# Altium footprint library ST Microelectronics STM32 G4.PcbLib: 21 footprints (part 2 of 3) (continued)
## UFQFPN-32 [mm]
pads (32):
  rect 0.6x0.3 smd paste-0.15 mask+0: 1(-2.35,1.75) 2(-2.35,1.25) 3(-2.35,0.75) 4(-2.35,0.25) 5(-2.35,-0.25) 6(-2.35,-0.75) 7(-2.35,-1.25) 8(-2.35,-1.75) 17(2.35,-1.75) 18(2.35,-1.25) 19(2.35,-0.75) 20(2.35,-0.25) 21(2.35,0.25) 22(2.35,0.75) 23(2.35,1.25) 24(2.35,1.75)
  rect 0.3x0.6 smd paste-0.15 mask+0: 9(-1.75,-2.35) 10(-1.25,-2.35) 11(-0.75,-2.35) 12(-0.25,-2.35) 13(0.25,-2.35) 14(0.75,-2.35) 15(1.25,-2.35) 16(1.75,-2.35) 25(1.75,2.35) 26(1.25,2.35) 27(0.75,2.35) 28(0.25,2.35) 29(-0.25,2.35) 30(-0.75,2.35) 31(-1.25,2.35) 32(-1.75,2.35)
Top Overlay:
  region: -0.56,2.904 -0.941,2.904 -0.941,3.158 -0.56,3.158
  region: 2.904,-0.059 3.158,-0.059 3.158,-0.44 2.904,-0.44
  region: -1.06,-2.904 -1.441,-2.904 -1.441,-3.158 -1.06,-3.158
  lines w0.152: -2.931,-2.078 -2.931,-2.931 -2.078,-2.931 ; -2.931,2.078 -2.931,2.931 -2.078,2.931 ; 2.078,-2.931 2.931,-2.931 2.931,-2.078 ; 2.078,2.931 2.931,2.931 2.931,2.078
  text "*" at -3.602,1.746 h1.27
Top Paste:
  region: -1.6,2.65 -1.9,2.65 -1.9,2.05 -1.6,2.05
  region: -1.1,2.65 -1.4,2.65 -1.4,2.05 -1.1,2.05
  region: -0.6,2.65 -0.9,2.65 -0.9,2.05 -0.6,2.05
  region: -0.1,2.65 -0.4,2.65 -0.4,2.05 -0.1,2.05
  region: 0.4,2.65 0.1,2.65 0.1,2.05 0.4,2.05
  region: 0.9,2.65 0.6,2.65 0.6,2.05 0.9,2.05
  region: 1.4,2.65 1.1,2.65 1.1,2.05 1.4,2.05
  region: 1.9,2.65 1.6,2.65 1.6,2.05 1.9,2.05
  region: 2.65,1.9 2.05,1.9 2.05,1.6 2.65,1.6
  region: 2.65,1.4 2.05,1.4 2.05,1.1 2.65,1.1
  region: 2.65,0.9 2.05,0.9 2.05,0.6 2.65,0.6
  region: 2.65,0.4 2.05,0.4 2.05,0.1 2.65,0.1
  region: 2.65,-0.1 2.05,-0.1 2.05,-0.4 2.65,-0.4
  region: 2.65,-0.6 2.05,-0.6 2.05,-0.9 2.65,-0.9
  region: 2.65,-1.1 2.05,-1.1 2.05,-1.4 2.65,-1.4
  region: 2.65,-1.6 2.05,-1.6 2.05,-1.9 2.65,-1.9
  region: 1.9,-2.05 1.6,-2.05 1.6,-2.65 1.9,-2.65
  region: 1.4,-2.05 1.1,-2.05 1.1,-2.65 1.4,-2.65
  region: 0.9,-2.05 0.6,-2.05 0.6,-2.65 0.9,-2.65
  region: 0.4,-2.05 0.1,-2.05 0.1,-2.65 0.4,-2.65
  region: -0.1,-2.05 -0.4,-2.05 -0.4,-2.65 -0.1,-2.65
  region: -0.6,-2.05 -0.9,-2.05 -0.9,-2.65 -0.6,-2.65
  region: -1.1,-2.05 -1.4,-2.05 -1.4,-2.65 -1.1,-2.65
  region: -1.6,-2.05 -1.9,-2.05 -1.9,-2.65 -1.6,-2.65
  region: -2.05,-1.6 -2.65,-1.6 -2.65,-1.9 -2.05,-1.9
  region: -2.05,-1.1 -2.65,-1.1 -2.65,-1.4 -2.05,-1.4
  region: -2.05,-0.6 -2.65,-0.6 -2.65,-0.9 -2.05,-0.9
  region: -2.05,-0.1 -2.65,-0.1 -2.65,-0.4 -2.05,-0.4
  region: -2.05,0.4 -2.65,0.4 -2.65,0.1 -2.05,0.1
  region: -2.05,0.9 -2.65,0.9 -2.65,0.6 -2.05,0.6
  region: -2.05,1.4 -2.65,1.4 -2.65,1.1 -2.05,1.1
  region: -2.05,1.9 -2.65,1.9 -2.65,1.6 -2.05,1.6
Top Solder:
  region: -1.6,2.65 -1.9,2.65 -1.9,2.05 -1.6,2.05
  region: -1.1,2.65 -1.4,2.65 -1.4,2.05 -1.1,2.05
  region: -0.6,2.65 -0.9,2.65 -0.9,2.05 -0.6,2.05
  region: -0.1,2.65 -0.4,2.65 -0.4,2.05 -0.1,2.05
  region: 0.4,2.65 0.1,2.65 0.1,2.05 0.4,2.05
  region: 0.9,2.65 0.6,2.65 0.6,2.05 0.9,2.05
  region: 1.4,2.65 1.1,2.65 1.1,2.05 1.4,2.05
  region: 1.9,2.65 1.6,2.65 1.6,2.05 1.9,2.05
  region: 2.65,1.9 2.05,1.9 2.05,1.6 2.65,1.6
  region: 2.65,1.4 2.05,1.4 2.05,1.1 2.65,1.1
  region: 2.65,0.9 2.05,0.9 2.05,0.6 2.65,0.6
  region: 2.65,0.4 2.05,0.4 2.05,0.1 2.65,0.1
  region: 2.65,-0.1 2.05,-0.1 2.05,-0.4 2.65,-0.4
  region: 2.65,-0.6 2.05,-0.6 2.05,-0.9 2.65,-0.9
  region: 2.65,-1.1 2.05,-1.1 2.05,-1.4 2.65,-1.4
  region: 2.65,-1.6 2.05,-1.6 2.05,-1.9 2.65,-1.9
  region: 1.9,-2.05 1.6,-2.05 1.6,-2.65 1.9,-2.65
  region: 1.4,-2.05 1.1,-2.05 1.1,-2.65 1.4,-2.65
  region: 0.9,-2.05 0.6,-2.05 0.6,-2.65 0.9,-2.65
  region: 0.4,-2.05 0.1,-2.05 0.1,-2.65 0.4,-2.65
  region: -0.1,-2.05 -0.4,-2.05 -0.4,-2.65 -0.1,-2.65
  region: -0.6,-2.05 -0.9,-2.05 -0.9,-2.65 -0.6,-2.65
  region: -1.1,-2.05 -1.4,-2.05 -1.4,-2.65 -1.1,-2.65
  region: -1.6,-2.05 -1.9,-2.05 -1.9,-2.65 -1.6,-2.65
  region: -2.05,-1.6 -2.65,-1.6 -2.65,-1.9 -2.05,-1.9
  region: -2.05,-1.1 -2.65,-1.1 -2.65,-1.4 -2.05,-1.4
  region: -2.05,-0.6 -2.65,-0.6 -2.65,-0.9 -2.05,-0.9
  region: -2.05,-0.1 -2.65,-0.1 -2.65,-0.4 -2.05,-0.4
  region: -2.05,0.4 -2.65,0.4 -2.65,0.1 -2.05,0.1
  region: -2.05,0.9 -2.65,0.9 -2.65,0.6 -2.05,0.6
  region: -2.05,1.4 -2.65,1.4 -2.65,1.1 -2.05,1.1
  region: -2.05,1.9 -2.65,1.9 -2.65,1.6 -2.05,1.6
Mechanical 5:
  region: 3.285,-3.285 -3.285,-3.285 -3.285,3.285 3.285,3.285
Mechanical 7:
  lines w0.025: -6.206,-2.55 2.55,-2.55 ; -6.206,2.55 2.55,2.55 2.55,-6.056 ; -2.55,-6.056 -2.55,2.55 ; -2.35,1.75 -2.35,7.326 ; 1.75,-2.35 7.476,-2.35 ; 1.75,2.35 7.476,2.35 ; 2.35,1.25 5.571,1.25 ; 2.35,7.326 2.35,1.75 5.571,1.75 ; 5.19,-0.02 5.19,1.25 ; 5.19,3.02 5.19,1.75 ; -5.825,-2.55 -5.698,-2.296 -5.952,-2.296 -5.825,-2.55 ; -5.825,-2.55 -5.825,2.55 ; -5.825,2.55 -5.698,2.296 -5.952,2.296 -5.825,2.55 ; -2.55,-5.675 -2.296,-5.802 -2.296,-5.548 -2.55,-5.675 ; -2.55,-5.675 2.55,-5.675 ; -2.35,6.945 -2.096,6.818 -2.096,7.072 -2.35,6.945 ; -2.35,6.945 2.35,6.945 ; 2.35,6.945 2.096,6.818 2.096,7.072 2.35,6.945 ; 2.55,-5.675 2.296,-5.802 2.296,-5.548 2.55,-5.675 ; 5.19,1.25 5.317,0.996 5.063,0.996 5.19,1.25 ; 5.19,1.75 5.317,2.004 5.063,2.004 5.19,1.75 ; 7.095,-2.35 7.222,-2.096 6.968,-2.096 7.095,-2.35 ; 7.095,-2.35 7.095,2.35 ; 7.095,2.35 7.222,2.096 6.968,2.096 7.095,2.35
  text "0.201in/5.1mm" at -2.064,-6.818 h0.64
  text "0.201in/5.1mm" at -10.46,-0.318 h0.64
  text "0.185in/4.7mm" at 7.603,-0.318 h0.64
  text "0.185in/4.7mm" at -2.064,7.453 h0.64
  text "0.02in/0.5mm" at 5.698,1.182 h0.64
  text "Alt 2 Padstyle: OX60Y90D30P" at -8.572,-14.946 h1.27
  text "Alt 1 Padstyle: OX90Y60D30P" at -8.572,-13.422 h1.27
  text "Default Padstyle: RX23p62Y11p81D0T" at -10.795,-8.85 h1.27
Mechanical 13:
  lines w0.025: -2.55,1.28 -1.28,2.55 ; -2.55,-2.55 -2.55,2.55 2.55,2.55 2.55,-2.55 -2.55,-2.55
  text "*" at -2.114,1.365 h1.27
Mechanical 15:
  region: -2.154,-2.804 -2.804,-2.804 -2.804,-2.154 -2.904,-2.154 -2.904,2.154 -2.804,2.154 -2.804,2.804 -2.154,2.804 -2.154,2.904 2.154,2.904 2.154,2.804 2.804,2.804 2.804,2.154 2.904,2.154 2.904,-2.154 2.804,-2.154 2.804,-2.804 2.154,-2.804 2.154,-2.904 -2.154,-2.904
  lines w0.152: -2.904,-2.154 -2.904,2.154 -2.804,2.154 -2.804,2.804 -2.154,2.804 -2.154,2.904 2.154,2.904 2.154,2.804 2.804,2.804 2.804,2.154 2.904,2.154 2.904,-2.154 2.804,-2.154 2.804,-2.804 2.154,-2.804 2.154,-2.904 -2.154,-2.904 -2.154,-2.804 -2.804,-2.804 -2.804,-2.154 -2.904,-2.154
3D body "UFQFPN-32.step": height 1.4, standoff 0, extent -2.601,-2.601 2.601,2.601

## UFQFPN-48_7X7X00 [mil]
pads (49):
  rect 36x12 smd paste+0 mask+0: 1(-138,108.27) 2(-138,88.58) 3(-138,68.9) 4(-138,49.21) 5(-138,29.53) 6(-138,9.84) 7(-138,-9.84) 8(-138,-29.53) 9(-138,-49.21) 10(-138,-68.9) 11(-138,-88.58) 12(-138,-108.27) 25(138,-108.27) 26(138,-88.58) 27(138,-68.9) 28(138,-49.21) 29(138,-29.53) 30(138,-9.84) 31(138,9.84) 32(138,29.53) 33(138,49.21) 34(138,68.9) 35(138,88.58) 36(138,108.27)
  rect 12x36 smd paste+0 mask+0: 13(-108.27,-138) 14(-88.58,-138) 15(-68.9,-138) 16(-49.21,-138) 17(-29.53,-138) 18(-9.84,-138) 19(9.84,-138) 20(29.53,-138) 21(49.21,-138) 22(68.9,-138) 23(88.58,-138) 24(108.27,-138) 37(108.27,138) 38(88.58,138) 39(68.9,138) 40(49.21,138) 41(29.53,138) 42(9.84,138) 43(-9.84,138) 44(-29.53,138) 45(-49.21,138) 46(-68.9,138) 47(-88.58,138) 48(-108.27,138)
  rect 224x224 smd paste-111.5 mask+0: 49(0,0)
Top Overlay:
  region: -166,-61.4 -176,-61.4 -176,-76.4 -166,-76.4
  region: 37.03,-166 22.03,-166 22.03,-176 37.03,-176
  region: 166,-2.34 176,-2.34 176,-17.34 166,-17.34
  region: 56.71,166 41.71,166 41.71,176 56.71,176
  lines w6: -145,-127.37 -145,-145 -127.37,-145 ; -145,127.37 -145,145 -127.37,145 ; 127.37,-145 145,-145 145,-127.37 ; 127.37,145 145,145 145,127.37
  text "*" at -193.5,93.11 h50
Top Paste:
  region: -59.94,108.06 -108.06,108.06 -108.06,59.94 -59.94,59.94
  region: -59.94,52.06 -108.06,52.06 -108.06,3.94 -59.94,3.94
  region: -59.94,-3.94 -108.06,-3.94 -108.06,-52.06 -59.94,-52.06
  region: -59.94,-59.94 -108.06,-59.94 -108.06,-108.06 -59.94,-108.06
  region: -3.94,108.06 -52.06,108.06 -52.06,59.94 -3.94,59.94
  region: -3.94,52.06 -52.06,52.06 -52.06,3.94 -3.94,3.94
  region: -3.94,-3.94 -52.06,-3.94 -52.06,-52.06 -3.94,-52.06
  region: -3.94,-59.94 -52.06,-59.94 -52.06,-108.06 -3.94,-108.06
  region: 52.06,108.06 3.94,108.06 3.94,59.94 52.06,59.94
  region: 52.06,52.06 3.94,52.06 3.94,3.94 52.06,3.94
  region: 52.06,-3.94 3.94,-3.94 3.94,-52.06 52.06,-52.06
  region: 52.06,-59.94 3.94,-59.94 3.94,-108.06 52.06,-108.06
  region: 108.06,108.06 59.94,108.06 59.94,59.94 108.06,59.94
  region: 108.06,52.06 59.94,52.06 59.94,3.94 108.06,3.94
  region: 108.06,-3.94 59.94,-3.94 59.94,-52.06 108.06,-52.06
  region: 108.06,-59.94 59.94,-59.94 59.94,-108.06 108.06,-108.06
Mechanical 5:
  region: 191,-191 -191,-191 -191,191 191,191
Mechanical 7:
  lines w1: -288,-140 140,-140 ; -288,140 140,140 140,-288 ; -140,-288 -140,140 ; -140,108.27 -140,338 ; 70,248 120,248 ; 108.27,-140 338,-140 ; 108.27,140 338,140 ; 120,108.27 120,263 ; 138,88.58 263,88.58 ; 138,108.27 263,108.27 ; 140,263 140,108.27 140,338 ; 190,248 140,248 ; 248,38.58 248,88.58 ; 248,158.27 248,108.27 ; -273,-140 -273,140 ; -273,-140 -278,-130 -268,-130 -273,-140 ; -273,140 -278,130 -268,130 -273,140 ; -140,-273 140,-273 ; -140,-273 -130,-268 -130,-278 -140,-273 ; -140,323 140,323 ; -140,323 -130,328 -130,318 -140,323 ; 120,248 110,253 110,243 120,248 ; 140,-273 130,-268 130,-278 140,-273 ; 140,248 150,253 150,243 140,248 ; 140,323 130,328 130,318 140,323 ; 248,88.58 243,78.58 253,78.58 248,88.58 ; 248,108.27 243,118.27 253,118.27 248,108.27 ; 323,-140 323,140 ; 323,-140 318,-130 328,-130 323,-140 ; 323,140 318,130 328,130 323,140
  text "Default Padstyle: RX36Y12D0T" at -350,-466 h50
  text "Heat Tab Padstyle: RX224Y224D0T" at -387.5,-526 h50
  text "Alt 1 Padstyle: OX90Y60D30P" at -337.5,-646 h50
  text "Alt 2 Padstyle: OX60Y90D30P" at -337.5,-706 h50
  text "0.02in/0.5mm" at 268,85.93 h25
  text "0.02in/0.508mm" at 42.5,268 h25
  text "0.28in/7.112mm" at -87.5,343 h25
  text "0.28in/7.112mm" at 343,-12.5 h25
  text "0.28in/7.112mm" at -468,-12.5 h25
  text "0.28in/7.112mm" at -87.5,-318 h25
Mechanical 13:
  lines w1: -140,90 -90,140 ; -140,-140 140,-140 140,140 -140,140 -140,-140 ; -140,-114.27 -140,-102.27 -140,-114.27 ; -140,-94.58 -140,-82.58 -140,-94.58 ; -140,-74.9 -140,-62.9 -140,-74.9 ; -140,-55.21 -140,-43.21 -140,-55.21 ; -140,-35.53 -140,-23.53 -140,-35.53 ; -140,-15.84 -140,-3.84 -140,-15.84 ; -140,3.84 -140,15.84 -140,3.84 ; -140,23.53 -140,35.53 -140,23.53 ; -140,43.21 -140,55.21 -140,43.21 ; -140,62.9 -140,74.9 -140,62.9 ; -140,82.58 -140,94.58 -140,82.58 ; -140,102.27 -140,114.27 -140,102.27 ; -114.27,-140 -102.27,-140 -114.27,-140 ; -114.27,140 -102.27,140 -114.27,140 ; -94.58,-140 -82.58,-140 -94.58,-140 ; -94.58,140 -82.58,140 -94.58,140 ; -74.9,-140 -62.9,-140 -74.9,-140 ; -74.9,140 -62.9,140 -74.9,140 ; -55.21,-140 -43.21,-140 -55.21,-140 ; -55.21,140 -43.21,140 -55.21,140 ; -35.53,-140 -23.53,-140 -35.53,-140 ; -35.53,140 -23.53,140 -35.53,140 ; -15.84,-140 -3.84,-140 -15.84,-140 ; -15.84,140 -3.84,140 -15.84,140 ; 3.84,-140 15.84,-140 3.84,-140 ; 3.84,140 15.84,140 3.84,140 ; 23.53,-140 35.53,-140 23.53,-140 ; 23.53,140 35.53,140 23.53,140 ; 43.21,-140 55.21,-140 43.21,-140 ; 43.21,140 55.21,140 43.21,140 ; 62.9,-140 74.9,-140 62.9,-140 ; 62.9,140 74.9,140 62.9,140 ; 82.58,-140 94.58,-140 82.58,-140 ; 82.58,140 94.58,140 82.58,140 ; 102.27,-140 114.27,-140 102.27,-140 ; 102.27,140 114.27,140 102.27,140 ; 140,-114.27 140,-102.27 140,-114.27 ; 140,-94.58 140,-82.58 140,-94.58 ; 140,-74.9 140,-62.9 140,-74.9 ; 140,-55.21 140,-43.21 140,-55.21 ; 140,-35.53 140,-23.53 140,-35.53 ; 140,-15.84 140,-3.84 140,-15.84 ; 140,3.84 140,15.84 140,3.84 ; 140,23.53 140,35.53 140,23.53 ; 140,43.21 140,55.21 140,43.21 ; 140,62.9 140,74.9 140,62.9 ; 140,82.58 140,94.58 140,82.58 ; 140,102.27 140,114.27 140,102.27
  text "*" at -132.5,93.11 h50
Mechanical 15:
  region: -118.11,-160 -160,-160 -160,-118.11 -170,-118.11 -170,118.11 -160,118.11 -160,160 -118.11,160 -118.11,170 118.11,170 118.11,160 160,160 160,118.11 170,118.11 170,-118.11 160,-118.11 160,-160 118.11,-160 118.11,-170 -118.11,-170
  lines w6: -170,-118.11 -160,-118.11 -160,-160 -118.11,-160 -118.11,-170 118.11,-170 118.11,-160 160,-160 160,-118.11 170,-118.11 170,118.11 160,118.11 160,160 118.11,160 118.11,170 -118.11,170 -118.11,160 -160,160 -160,118.11 -170,118.11 -170,-118.11
3D body "UFQFPN-48_7X7X00.step": height 24.09, standoff 0, extent -139.99,-139.99 140.01,140.01

## UFQFPN-48_7X7X0P [mil]
pads (49):
  rect 32x12 smd paste+0 mask+0: 1(-136,108.27) 2(-136,88.58) 3(-136,68.9) 4(-136,49.21) 5(-136,29.53) 6(-136,9.84) 7(-136,-9.84) 8(-136,-29.53) 9(-136,-49.21) 10(-136,-68.9) 11(-136,-88.58) 12(-136,-108.27) 25(136,-108.27) 26(136,-88.58) 27(136,-68.9) 28(136,-49.21) 29(136,-29.53) 30(136,-9.84) 31(136,9.84) 32(136,29.53) 33(136,49.21) 34(136,68.9) 35(136,88.58) 36(136,108.27)
  rect 12x32 smd paste+0 mask+0: 13(-108.27,-136) 14(-88.58,-136) 15(-68.9,-136) 16(-49.21,-136) 17(-29.53,-136) 18(-9.84,-136) 19(9.84,-136) 20(29.53,-136) 21(49.21,-136) 22(68.9,-136) 23(88.58,-136) 24(108.27,-136) 37(108.27,136) 38(88.58,136) 39(68.9,136) 40(49.21,136) 41(29.53,136) 42(9.84,136) 43(-9.84,136) 44(-29.53,136) 45(-49.21,136) 46(-68.9,136) 47(-88.58,136) 48(-108.27,136)
  rect 224x224 smd paste-111.5 mask+0: 49(0,0)
Top Overlay:
  region: -162,-61.4 -172,-61.4 -172,-76.4 -162,-76.4
  region: 37.03,-162 22.03,-162 22.03,-172 37.03,-172
  region: 162,-2.34 172,-2.34 172,-17.34 162,-17.34
  region: 56.71,162 41.71,162 41.71,172 56.71,172
  lines w6: -145,-127.37 -145,-145 -127.37,-145 ; -145,127.37 -145,145 -127.37,145 ; 127.37,-145 145,-145 145,-127.37 ; 127.37,145 145,145 145,127.37
  text "*" at -189.5,93.11 h50
Top Paste:
  region: -59.94,108.06 -108.06,108.06 -108.06,59.94 -59.94,59.94
  region: -59.94,52.06 -108.06,52.06 -108.06,3.94 -59.94,3.94
  region: -59.94,-3.94 -108.06,-3.94 -108.06,-52.06 -59.94,-52.06
  region: -59.94,-59.94 -108.06,-59.94 -108.06,-108.06 -59.94,-108.06
  region: -3.94,108.06 -52.06,108.06 -52.06,59.94 -3.94,59.94
  region: -3.94,52.06 -52.06,52.06 -52.06,3.94 -3.94,3.94
  region: -3.94,-3.94 -52.06,-3.94 -52.06,-52.06 -3.94,-52.06
  region: -3.94,-59.94 -52.06,-59.94 -52.06,-108.06 -3.94,-108.06
  region: 52.06,108.06 3.94,108.06 3.94,59.94 52.06,59.94
  region: 52.06,52.06 3.94,52.06 3.94,3.94 52.06,3.94
  region: 52.06,-3.94 3.94,-3.94 3.94,-52.06 52.06,-52.06
  region: 52.06,-59.94 3.94,-59.94 3.94,-108.06 52.06,-108.06
  region: 108.06,108.06 59.94,108.06 59.94,59.94 108.06,59.94
  region: 108.06,52.06 59.94,52.06 59.94,3.94 108.06,3.94
  region: 108.06,-3.94 59.94,-3.94 59.94,-52.06 108.06,-52.06
  region: 108.06,-59.94 59.94,-59.94 59.94,-108.06 108.06,-108.06
Mechanical 5:
  region: 177,-177 -177,-177 -177,177 177,177
Mechanical 7:
  lines w1: -286,-140 140,-140 ; -286,140 140,140 140,-286 ; -140,-286 -140,140 ; -140,108.27 -140,336 ; 70,246 120,246 ; 108.27,-140 336,-140 ; 108.27,140 336,140 ; 120,108.27 120,261 ; 136,88.58 261,88.58 ; 136,108.27 261,108.27 ; 140,261 140,108.27 140,336 ; 190,246 140,246 ; 246,38.58 246,88.58 ; 246,158.27 246,108.27 ; -271,-140 -271,140 ; -271,-140 -276,-130 -266,-130 -271,-140 ; -271,140 -276,130 -266,130 -271,140 ; -140,-271 140,-271 ; -140,-271 -130,-266 -130,-276 -140,-271 ; -140,321 140,321 ; -140,321 -130,326 -130,316 -140,321 ; 120,246 110,251 110,241 120,246 ; 140,-271 130,-266 130,-276 140,-271 ; 140,246 150,251 150,241 140,246 ; 140,321 130,326 130,316 140,321 ; 246,88.58 241,78.58 251,78.58 246,88.58 ; 246,108.27 241,118.27 251,118.27 246,108.27 ; 321,-140 321,140 ; 321,-140 316,-130 326,-130 321,-140 ; 321,140 316,130 326,130 321,140
  text "Default Padstyle: RX32Y12D0T" at -350,-462 h50
  text "Heat Tab Padstyle: RX224Y224D0T" at -387.5,-522 h50
  text "Alt 1 Padstyle: OX90Y60D30P" at -337.5,-642 h50
  text "Alt 2 Padstyle: OX60Y90D30P" at -337.5,-702 h50
  text "0.02in/0.5mm" at 266,85.93 h25
  text "0.02in/0.508mm" at 42.5,266 h25
  text "0.28in/7.112mm" at -87.5,341 h25
  text "0.28in/7.112mm" at 341,-12.5 h25
  text "0.28in/7.112mm" at -466,-12.5 h25
  text "0.28in/7.112mm" at -87.5,-316 h25
Mechanical 13:
  lines w1: -140,90 -90,140 ; -140,-140 140,-140 140,140 -140,140 -140,-140 ; -140,-114.27 -140,-102.27 -140,-114.27 ; -140,-94.58 -140,-82.58 -140,-94.58 ; -140,-74.9 -140,-62.9 -140,-74.9 ; -140,-55.21 -140,-43.21 -140,-55.21 ; -140,-35.53 -140,-23.53 -140,-35.53 ; -140,-15.84 -140,-3.84 -140,-15.84 ; -140,3.84 -140,15.84 -140,3.84 ; -140,23.53 -140,35.53 -140,23.53 ; -140,43.21 -140,55.21 -140,43.21 ; -140,62.9 -140,74.9 -140,62.9 ; -140,82.58 -140,94.58 -140,82.58 ; -140,102.27 -140,114.27 -140,102.27 ; -114.27,-140 -102.27,-140 -114.27,-140 ; -114.27,140 -102.27,140 -114.27,140 ; -94.58,-140 -82.58,-140 -94.58,-140 ; -94.58,140 -82.58,140 -94.58,140 ; -74.9,-140 -62.9,-140 -74.9,-140 ; -74.9,140 -62.9,140 -74.9,140 ; -55.21,-140 -43.21,-140 -55.21,-140 ; -55.21,140 -43.21,140 -55.21,140 ; -35.53,-140 -23.53,-140 -35.53,-140 ; -35.53,140 -23.53,140 -35.53,140 ; -15.84,-140 -3.84,-140 -15.84,-140 ; -15.84,140 -3.84,140 -15.84,140 ; 3.84,-140 15.84,-140 3.84,-140 ; 3.84,140 15.84,140 3.84,140 ; 23.53,-140 35.53,-140 23.53,-140 ; 23.53,140 35.53,140 23.53,140 ; 43.21,-140 55.21,-140 43.21,-140 ; 43.21,140 55.21,140 43.21,140 ; 62.9,-140 74.9,-140 62.9,-140 ; 62.9,140 74.9,140 62.9,140 ; 82.58,-140 94.58,-140 82.58,-140 ; 82.58,140 94.58,140 82.58,140 ; 102.27,-140 114.27,-140 102.27,-140 ; 102.27,140 114.27,140 102.27,140 ; 140,-114.27 140,-102.27 140,-114.27 ; 140,-94.58 140,-82.58 140,-94.58 ; 140,-74.9 140,-62.9 140,-74.9 ; 140,-55.21 140,-43.21 140,-55.21 ; 140,-35.53 140,-23.53 140,-35.53 ; 140,-15.84 140,-3.84 140,-15.84 ; 140,3.84 140,15.84 140,3.84 ; 140,23.53 140,35.53 140,23.53 ; 140,43.21 140,55.21 140,43.21 ; 140,62.9 140,74.9 140,62.9 ; 140,82.58 140,94.58 140,82.58 ; 140,102.27 140,114.27 140,102.27
  text "*" at -132.5,93.11 h50
Mechanical 15:
  region: -118.11,-150 -150,-150 -150,-118.11 -160,-118.11 -160,118.11 -150,118.11 -150,150 -118.11,150 -118.11,160 118.11,160 118.11,150 150,150 150,118.11 160,118.11 160,-118.11 150,-118.11 150,-150 118.11,-150 118.11,-160 -118.11,-160
  lines w6: -160,-118.11 -150,-118.11 -150,-150 -118.11,-150 -118.11,-160 118.11,-160 118.11,-150 150,-150 150,-118.11 160,-118.11 160,118.11 150,118.11 150,150 118.11,150 118.11,160 -118.11,160 -118.11,150 -150,150 -150,118.11 -160,118.11 -160,-118.11
3D body "UFQFPN-48_7X7X0P.step": height 24.09, standoff 0, extent -139.99,-139.99 140.01,140.01

## UFQFPN-48_7X7X01 [mil]
pads (49):
  rect 28x12 smd paste+0 mask+0: 1(-134,108.27) 2(-134,88.58) 3(-134,68.9) 4(-134,49.21) 5(-134,29.53) 6(-134,9.84) 7(-134,-9.84) 8(-134,-29.53) 9(-134,-49.21) 10(-134,-68.9) 11(-134,-88.58) 12(-134,-108.27) 25(134,-108.27) 26(134,-88.58) 27(134,-68.9) 28(134,-49.21) 29(134,-29.53) 30(134,-9.84) 31(134,9.84) 32(134,29.53) 33(134,49.21) 34(134,68.9) 35(134,88.58) 36(134,108.27)
  rect 12x28 smd paste+0 mask+0: 13(-108.27,-134) 14(-88.58,-134) 15(-68.9,-134) 16(-49.21,-134) 17(-29.53,-134) 18(-9.84,-134) 19(9.84,-134) 20(29.53,-134) 21(49.21,-134) 22(68.9,-134) 23(88.58,-134) 24(108.27,-134) 37(108.27,134) 38(88.58,134) 39(68.9,134) 40(49.21,134) 41(29.53,134) 42(9.84,134) 43(-9.84,134) 44(-29.53,134) 45(-49.21,134) 46(-68.9,134) 47(-88.58,134) 48(-108.27,134)
  rect 224x224 smd paste-111.5 mask+0: 49(0,0)
Top Overlay:
  region: 56.71,158 41.71,158 41.71,168 56.71,168
  region: 158,-2.34 168,-2.34 168,-17.34 158,-17.34
  region: 37.03,-158 22.03,-158 22.03,-168 37.03,-168
  region: -158,-61.4 -168,-61.4 -168,-76.4 -158,-76.4
  lines w6: -145,-127.37 -145,-145 -127.37,-145 ; -145,127.37 -145,145 -127.37,145 ; 127.37,-145 145,-145 145,-127.37 ; 127.37,145 145,145 145,127.37
  text "*" at -185.5,93.11 h50
Top Paste:
  region: 108.06,-59.94 59.94,-59.94 59.94,-108.06 108.06,-108.06
  region: 108.06,-3.94 59.94,-3.94 59.94,-52.06 108.06,-52.06
  region: 108.06,52.06 59.94,52.06 59.94,3.94 108.06,3.94
  region: 108.06,108.06 59.94,108.06 59.94,59.94 108.06,59.94
  region: 52.06,-59.94 3.94,-59.94 3.94,-108.06 52.06,-108.06
  region: 52.06,-3.94 3.94,-3.94 3.94,-52.06 52.06,-52.06
  region: 52.06,52.06 3.94,52.06 3.94,3.94 52.06,3.94
  region: 52.06,108.06 3.94,108.06 3.94,59.94 52.06,59.94
  region: -3.94,-59.94 -52.06,-59.94 -52.06,-108.06 -3.94,-108.06
  region: -3.94,-3.94 -52.06,-3.94 -52.06,-52.06 -3.94,-52.06
  region: -3.94,52.06 -52.06,52.06 -52.06,3.94 -3.94,3.94
  region: -3.94,108.06 -52.06,108.06 -52.06,59.94 -3.94,59.94
  region: -59.94,-59.94 -108.06,-59.94 -108.06,-108.06 -59.94,-108.06
  region: -59.94,-3.94 -108.06,-3.94 -108.06,-52.06 -59.94,-52.06
  region: -59.94,52.06 -108.06,52.06 -108.06,3.94 -59.94,3.94
  region: -59.94,108.06 -108.06,108.06 -108.06,59.94 -59.94,59.94
Mechanical 5:
  region: 167,-167 -167,-167 -167,167 167,167
Mechanical 7:
  lines w1: -284,-140 140,-140 ; -284,140 140,140 140,-284 ; -140,-284 -140,140 ; -140,108.27 -140,334 ; 70,244 120,244 ; 108.27,-140 334,-140 ; 108.27,140 334,140 ; 120,108.27 120,259 ; 134,88.58 259,88.58 ; 134,108.27 259,108.27 ; 140,259 140,108.27 140,334 ; 190,244 140,244 ; 244,38.58 244,88.58 ; 244,158.27 244,108.27 ; -269,-140 -264,-130 -274,-130 -269,-140 ; -269,-140 -269,140 ; -269,140 -264,130 -274,130 -269,140 ; -140,-269 -130,-274 -130,-264 -140,-269 ; -140,-269 140,-269 ; -140,319 -130,314 -130,324 -140,319 ; -140,319 140,319 ; 120,244 110,239 110,249 120,244 ; 140,-269 130,-274 130,-264 140,-269 ; 140,244 150,239 150,249 140,244 ; 140,319 130,314 130,324 140,319 ; 244,88.58 249,78.58 239,78.58 244,88.58 ; 244,108.27 249,118.27 239,118.27 244,108.27 ; 319,-140 324,-130 314,-130 319,-140 ; 319,-140 319,140 ; 319,140 324,130 314,130 319,140
  text "0.28in/7.112mm" at -87.5,-314 h25
  text "0.28in/7.112mm" at -464,-12.5 h25
  text "0.28in/7.112mm" at 339,-12.5 h25
  text "0.28in/7.112mm" at -87.5,339 h25
  text "0.02in/0.508mm" at 42.5,264 h25
  text "0.02in/0.5mm" at 264,85.93 h25
  text "Alt 2 Padstyle: OX60Y90D30P" at -337.5,-698 h50
  text "Alt 1 Padstyle: OX90Y60D30P" at -337.5,-638 h50
  text "Heat Tab Padstyle: RX224Y224D0T" at -387.5,-518 h50
  text "Default Padstyle: RX28Y12D0T" at -350,-458 h50
Mechanical 13:
  lines w1: -140,90 -90,140 ; -140,-140 -140,140 140,140 140,-140 -140,-140 ; -140,-114.27 -140,-102.27 -140,-114.27 ; -140,-94.58 -140,-82.58 -140,-94.58 ; -140,-74.9 -140,-62.9 -140,-74.9 ; -140,-55.21 -140,-43.21 -140,-55.21 ; -140,-35.53 -140,-23.53 -140,-35.53 ; -140,-15.84 -140,-3.84 -140,-15.84 ; -140,3.84 -140,15.84 -140,3.84 ; -140,23.53 -140,35.53 -140,23.53 ; -140,43.21 -140,55.21 -140,43.21 ; -140,62.9 -140,74.9 -140,62.9 ; -140,82.58 -140,94.58 -140,82.58 ; -140,102.27 -140,114.27 -140,102.27 ; -114.27,-140 -102.27,-140 -114.27,-140 ; -114.27,140 -102.27,140 -114.27,140 ; -94.58,-140 -82.58,-140 -94.58,-140 ; -94.58,140 -82.58,140 -94.58,140 ; -74.9,-140 -62.9,-140 -74.9,-140 ; -74.9,140 -62.9,140 -74.9,140 ; -55.21,-140 -43.21,-140 -55.21,-140 ; -55.21,140 -43.21,140 -55.21,140 ; -35.53,-140 -23.53,-140 -35.53,-140 ; -35.53,140 -23.53,140 -35.53,140 ; -15.84,-140 -3.84,-140 -15.84,-140 ; -15.84,140 -3.84,140 -15.84,140 ; 3.84,-140 15.84,-140 3.84,-140 ; 3.84,140 15.84,140 3.84,140 ; 23.53,-140 35.53,-140 23.53,-140 ; 23.53,140 35.53,140 23.53,140 ; 43.21,-140 55.21,-140 43.21,-140 ; 43.21,140 55.21,140 43.21,140 ; 62.9,-140 74.9,-140 62.9,-140 ; 62.9,140 74.9,140 62.9,140 ; 82.58,-140 94.58,-140 82.58,-140 ; 82.58,140 94.58,140 82.58,140 ; 102.27,-140 114.27,-140 102.27,-140 ; 102.27,140 114.27,140 102.27,140 ; 140,-114.27 140,-102.27 140,-114.27 ; 140,-94.58 140,-82.58 140,-94.58 ; 140,-74.9 140,-62.9 140,-74.9 ; 140,-55.21 140,-43.21 140,-55.21 ; 140,-35.53 140,-23.53 140,-35.53 ; 140,-15.84 140,-3.84 140,-15.84 ; 140,3.84 140,15.84 140,3.84 ; 140,23.53 140,35.53 140,23.53 ; 140,43.21 140,55.21 140,43.21 ; 140,62.9 140,74.9 140,62.9 ; 140,82.58 140,94.58 140,82.58 ; 140,102.27 140,114.27 140,102.27
  text "*" at -132.5,93.11 h50
Mechanical 15:
  region: -118.11,-144 -144,-144 -144,-118.11 -154,-118.11 -154,118.11 -144,118.11 -144,144 -118.11,144 -118.11,154 118.11,154 118.11,144 144,144 144,118.11 154,118.11 154,-118.11 144,-118.11 144,-144 118.11,-144 118.11,-154 -118.11,-154
  lines w6: -154,-118.11 -154,118.11 -144,118.11 -144,144 -118.11,144 -118.11,154 118.11,154 118.11,144 144,144 144,118.11 154,118.11 154,-118.11 144,-118.11 144,-144 118.11,-144 118.11,-154 -118.11,-154 -118.11,-144 -144,-144 -144,-118.11 -154,-118.11
3D body "UFQFPN-48_7X7X01.step": height 24.09, standoff 0, extent -139.99,-139.99 140.01,140.01

## WLCSP49 [mil]
pads (49):
  round 11 hole 10 mask+0: A1(-47.24,47.24) A2(-31.5,47.24) A3(-15.75,47.24) A4(0,47.24) A5(15.75,47.24) A6(31.5,47.24) A7(47.24,47.24) B1(-47.24,31.5) B2(-31.5,31.5) B3(-15.75,31.5) B4(0,31.5) B5(15.75,31.5) B6(31.5,31.5) B7(47.24,31.5) C1(-47.24,15.75) C2(-31.5,15.75) C3(-15.75,15.75) C4(0,15.75) C5(15.75,15.75) C6(31.5,15.75) C7(47.24,15.75) D1(-47.24,0) D2(-31.5,0) D3(-15.75,0) D4(0,0) D5(15.75,0) D6(31.5,0) D7(47.24,0) E1(-47.24,-15.75) E2(-31.5,-15.75) E3(-15.75,-15.75) E4(0,-15.75) E5(15.75,-15.75) E6(31.5,-15.75) E7(47.24,-15.75) F1(-47.24,-31.5) F2(-31.5,-31.5) F3(-15.75,-31.5) F4(0,-31.5) F5(15.75,-31.5) F6(31.5,-31.5) F7(47.24,-31.5) G1(-47.24,-47.24) G2(-31.5,-47.24) G3(-15.75,-47.24) G4(0,-47.24) G5(15.75,-47.24) G6(31.5,-47.24) G7(47.24,-47.24)
Top Overlay:
  lines w6: -67.5,-67 67.5,-67 67.5,67 -67.5,67 -67.5,-67
  text "A" at -112.5,22.24 h50
  text "G" at -112.5,-72.24 h50
  text "1" at -22.24,87 h50
  text "7" at 72.24,87 h50
Bottom Overlay:
  text "A" at -87.5,22.24 h50
  text "G" at -87.5,-72.24 h50
  text "1" at -72.24,87 h50
  text "7" at 22.24,87 h50
Keep-Out Layer:
  region: -72.62,-72.62 -72.62,72.62 72.62,72.62 72.62,-72.62
Mechanical 5:
  region: 77.5,-77 -77.5,-77 -77.5,77 77.5,77
Mechanical 7:
  lines w1: -112.5,137 -62.5,137 ; -62.5,0 -62.5,152 ; 0,-62 227.5,-62 ; 0,62 227.5,62 ; 47.24,31.5 152.5,31.5 ; 47.24,47.24 152.5,47.24 ; 62.5,0 62.5,152 ; 112.5,137 62.5,137 ; 137.5,-18.5 137.5,31.5 ; 137.5,97.24 137.5,47.24 ; 212.5,-112 212.5,-62 ; 212.5,112 212.5,62 ; -62.5,137 -72.5,142 -72.5,132 -62.5,137 ; 62.5,137 72.5,142 72.5,132 62.5,137 ; 137.5,31.5 132.5,21.5 142.5,21.5 137.5,31.5 ; 137.5,47.24 132.5,57.24 142.5,57.24 137.5,47.24 ; 212.5,-62 207.5,-72 217.5,-72 212.5,-62 ; 212.5,62 207.5,72 217.5,72 212.5,62
  text "Default Padstyle: EX11Y11D10PA" at -375,-262 h50
  text "0.016in/0.4mm" at 157.5,26.87 h25
  text "0.125in/3.175mm" at -93.75,157 h25
  text "0.124in/3.15mm" at 232.5,-12.5 h25
Mechanical 13:
  lines w1: -62.5,54.13 -54.63,62 ; -62.5,-62 62.5,-62 62.5,62 -62.5,62 -62.5,-62
  text "A" at -112.5,22.24 h50
  text "G" at -112.5,-72.24 h50
  text "1" at -22.24,87 h50
  text "7" at 72.24,87 h50
Mechanical 15:
  region: 72.5,-72 -72.5,-72 -72.5,72 72.5,72
  lines w6: -72.5,-72 -72.5,72 72.5,72 72.5,-72 -72.5,-72
3D body "WLCSP49.step": height 23.11, standoff 0.01, extent -62.51,-62 62.52,62.01